# Altium footprint library LukaLIBRARY.PcbLib: 784 footprints (part 46 of 49)
Each footprint in its own frame and in the unit in brackets; x right, y up, seen from the top. Pads: shape width x height; smd on the part's side, far side on the other; paste and mask are expansions set on the pad; w line width, h text height; cw(c..) or ccw(c..) is an arc to the next point about the centre after c.
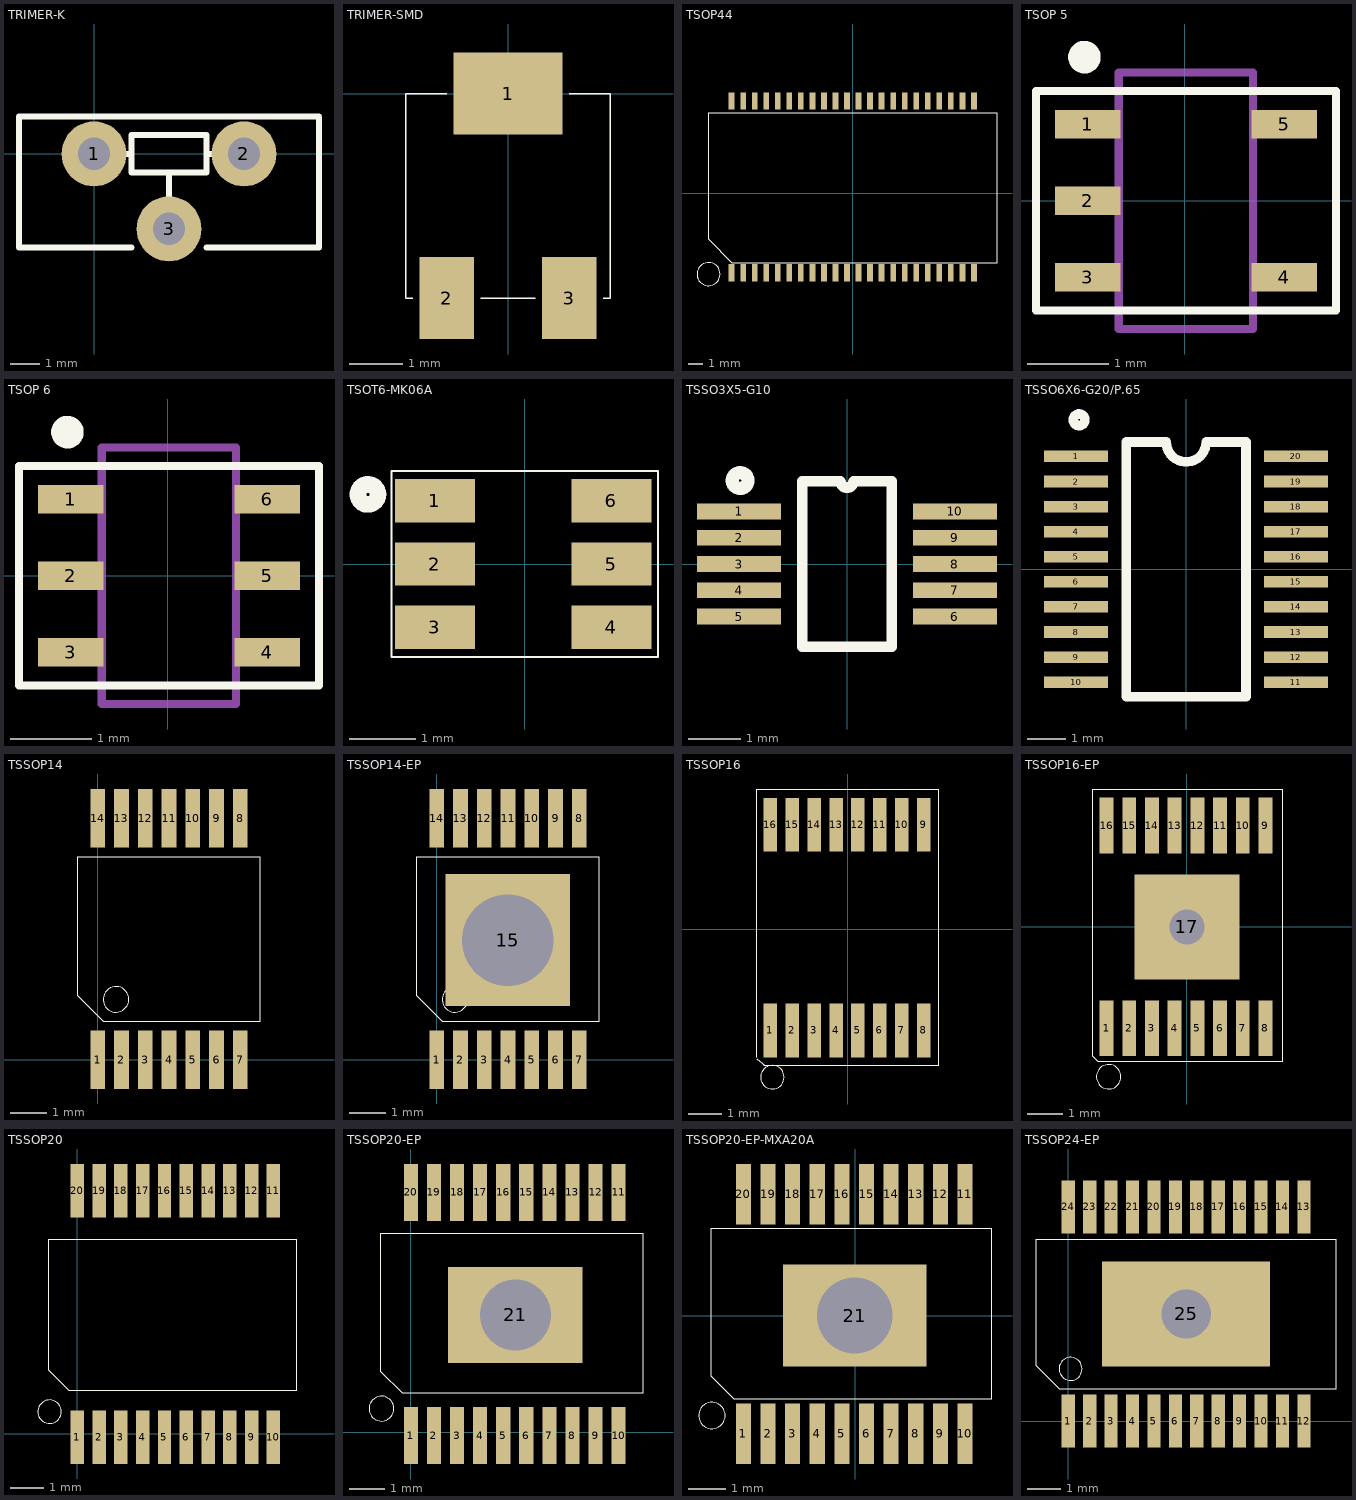
[diagram p45: the footprints below, top view; thin cyan lines are the x and y axes]

## TRIMER-K [mm]
pads (3):
  round 2.2 hole 1.1 mask-25.4: 1(0,0) 2(5.08,0) 3(2.54,-2.54)
Top Overlay:
  lines w0.2: 0.635,0 1.27,0 ; 1.27,-3.175 -2.54,-3.175 -2.54,1.27 7.62,1.27 7.62,-3.175 3.81,-3.175 ; 2.54,-1.905 2.54,-0.635 ; 3.81,0 4.445,0 ; 1.27,-0.635 3.81,-0.635 3.81,0.635 1.27,0.635 1.27,-0.635
Top Solder:
  region: 2.54,-1.431 2.253,-1.468 1.985,-1.579 1.755,-1.755 1.579,-1.985 1.468,-2.253 1.431,-2.54 1.468,-2.827 1.579,-3.095 1.755,-3.325 1.985,-3.501 2.253,-3.612 2.54,-3.649 2.827,-3.612 3.095,-3.501 3.325,-3.325 3.501,-3.095 3.612,-2.827 3.649,-2.54 3.612,-2.253 3.501,-1.985 3.325,-1.755 3.095,-1.579 2.827,-1.468
  region: 5.08,1.109 4.793,1.072 4.525,0.961 4.295,0.785 4.119,0.555 4.008,0.287 3.971,0 4.008,-0.287 4.119,-0.555 4.295,-0.785 4.525,-0.961 4.793,-1.072 5.08,-1.109 5.367,-1.072 5.635,-0.961 5.865,-0.785 6.041,-0.555 6.152,-0.287 6.189,0 6.152,0.287 6.041,0.555 5.865,0.785 5.635,0.961 5.367,1.072
  region: 0,1.109 -0.287,1.072 -0.555,0.961 -0.785,0.785 -0.961,0.555 -1.072,0.287 -1.109,0 -1.072,-0.287 -0.961,-0.555 -0.785,-0.785 -0.555,-0.961 -0.287,-1.072 0,-1.109 0.287,-1.072 0.555,-0.961 0.785,-0.785 0.961,-0.555 1.072,-0.287 1.109,0 1.072,0.287 0.961,0.555 0.785,0.785 0.555,0.961 0.287,1.072
Bottom Solder:
  region: 2.54,-1.431 2.253,-1.468 1.985,-1.579 1.755,-1.755 1.579,-1.985 1.468,-2.253 1.431,-2.54 1.468,-2.827 1.579,-3.095 1.755,-3.325 1.985,-3.501 2.253,-3.612 2.54,-3.649 2.827,-3.612 3.095,-3.501 3.325,-3.325 3.501,-3.095 3.612,-2.827 3.649,-2.54 3.612,-2.253 3.501,-1.985 3.325,-1.755 3.095,-1.579 2.827,-1.468
  region: 5.08,1.109 4.793,1.072 4.525,0.961 4.295,0.785 4.119,0.555 4.008,0.287 3.971,0 4.008,-0.287 4.119,-0.555 4.295,-0.785 4.525,-0.961 4.793,-1.072 5.08,-1.109 5.367,-1.072 5.635,-0.961 5.865,-0.785 6.041,-0.555 6.152,-0.287 6.189,0 6.152,0.287 6.041,0.555 5.865,0.785 5.635,0.961 5.367,1.072
  region: 0,1.109 -0.287,1.072 -0.555,0.961 -0.785,0.785 -0.961,0.555 -1.072,0.287 -1.109,0 -1.072,-0.287 -0.961,-0.555 -0.785,-0.785 -0.555,-0.961 -0.287,-1.072 0,-1.109 0.287,-1.072 0.555,-0.961 0.785,-0.785 0.961,-0.555 1.072,-0.287 1.109,0 1.072,0.287 0.961,0.555 0.785,0.785 0.555,0.961 0.287,1.072

## TRIMER-SMD [mil]
pads (3):
  rect 80x60 smd: 1(0,0)
  rect 40x60 smd: 2(-45,-150) 3(45,-150)
Top Overlay:
  lines w1: -70,-150 -75,-150 -75,0 -45,0 ; -20,-150 20,-150 ; 45,0 75,0 75,-150 70,-150

## TSOP44 [mm]
pads (44):
  rect 0.4x1.2 smd: 1(-8.4,-5.5) 2(-7.6,-5.5) 3(-6.8,-5.5) 4(-6,-5.5) 5(-5.2,-5.5) 6(-4.4,-5.5) 7(-3.6,-5.5) 8(-2.8,-5.5) 9(-2,-5.5) 10(-1.2,-5.5) 11(-0.4,-5.5) 12(0.4,-5.5) 13(1.2,-5.5) 14(2,-5.5) 15(2.8,-5.5) 16(3.6,-5.5) 17(4.4,-5.5) 18(5.2,-5.5) 19(6,-5.5) 20(6.8,-5.5) 21(7.6,-5.5) 22(8.4,-5.5) 23(8.4,6.4) 24(7.6,6.4) 25(6.8,6.4) 26(6,6.4) 27(5.2,6.4) 28(4.4,6.4) 29(3.6,6.4) 30(2.8,6.4) 31(2,6.4) 32(1.2,6.4) 33(0.4,6.4) 34(-0.4,6.4) 35(-1.2,6.4) 36(-2,6.4) 37(-2.8,6.4) 38(-3.6,6.4) 39(-4.4,6.4) 40(-5.2,6.4) 41(-6,6.4) 42(-6.8,6.4) 43(-7.6,6.4) 44(-8.4,6.4)
Top Overlay:
  circle w0.01: c-10,-5.6 r0.8
  lines w0.01: -10,-3.2 -8.4,-4.8 10,-4.8 10,5.6 -10,5.6 -10,-3.2

## TSOP 5 [mm]
pads (5):
  rect 0.8x0.35 smd: 1(-1.194,0.94) 2(-1.194,0) 3(-1.194,-0.94) 4(1.219,-0.94) 5(1.219,0.94)
Top Overlay:
  circle w0.2: c-1.234,1.763 r0.1
  lines w0.1: -1.829,-1.346 -1.829,1.346 1.854,1.346 1.854,-1.346 -1.829,-1.346
Mechanical 15:
  lines w0.1: -0.813,-1.575 0.837,-1.575 0.837,1.575 -0.813,1.575 -0.813,-1.575

## TSOP 6 [mm]
pads (6):
  rect 0.8x0.35 smd: 1(-1.194,0.94) 2(-1.194,0) 3(-1.194,-0.94) 4(1.219,-0.94) 5(1.219,0) 6(1.219,0.94)
Top Overlay:
  circle w0.2: c-1.234,1.763 r0.1
  lines w0.1: -1.829,-1.346 -1.829,1.346 1.854,1.346 1.854,-1.346 -1.829,-1.346
Mechanical 15:
  lines w0.1: -0.813,-1.575 0.837,-1.575 0.837,1.575 -0.813,1.575 -0.813,-1.575

## TSOT6-MK06A [mm]
pads (6):
  rect 1.2x0.65 smd mask-25.4: 1(-1.35,0.95) 2(-1.35,0) 3(-1.35,-0.95) 4(1.3,-0.95) 5(1.3,0) 6(1.3,0.95)
Top Overlay:
  circle w0.25: c-2.355,1.045 r0.15
  lines w0.03: -2,-1.4 2,-1.4 2,1.4 -2,1.4 -2,-1.4
Top Solder:
  region: -1.85,-0.35 -0.85,-0.35 -0.85,0.35 -1.85,0.35
  region: -1.85,-1.3 -0.85,-1.3 -0.85,-0.6 -1.85,-0.6
  region: 0.8,-1.3 1.8,-1.3 1.8,-0.6 0.8,-0.6
  region: 0.8,-0.35 1.8,-0.35 1.8,0.35 0.8,0.35
  region: 0.8,0.6 1.8,0.6 1.8,1.3 0.8,1.3
  region: -1.85,0.6 -0.85,0.6 -0.85,1.3 -1.85,1.3

## TSSO3X5-G10 [mm]
pads (10):
  rect 1.6x0.3 smd: 1(-2.05,1) 2(-2.05,0.5) 3(-2.05,0) 4(-2.05,-0.5) 5(-2.05,-1) 6(2.05,-1) 7(2.05,-0.5) 8(2.05,0) 9(2.05,0.5) 10(2.05,1)
Top Overlay:
  circle w0.25: c-2.032,1.585 r0.15
  lines w0.2: -0.85,-1.575 -0.85,1.575 -0.125,1.575 ccw(c0,1.575) 0.125,1.575 0.85,1.575 0.85,-1.575 -0.85,-1.575

## TSSO6X6-G20/P.65 [mm]
pads (20):
  rect 1.65x0.3 smd: 1(-2.855,2.925) 2(-2.855,2.275) 3(-2.855,1.625) 4(-2.855,0.975) 5(-2.855,0.325) 6(-2.855,-0.325) 7(-2.855,-0.975) 8(-2.855,-1.625) 9(-2.855,-2.275) 10(-2.855,-2.925) 11(2.845,-2.925) 12(2.845,-2.275) 13(2.845,-1.625) 14(2.845,-0.975) 15(2.845,-0.325) 16(2.845,0.325) 17(2.845,0.975) 18(2.845,1.625) 19(2.845,2.275) 20(2.845,2.925)
Top Overlay:
  circle w0.25: c-2.775,3.875 r0.15
  lines w0.25: -1.55,-3.3 -1.55,3.3 -0.517,3.3 ccw(c0,3.3) 0.517,3.3 1.55,3.3 1.55,-3.3 -1.55,-3.3

## TSSOP14 [mm]
pads (14):
  rect 0.4x1.6 smd: 1(0,0) 2(0.65,0) 3(1.3,0) 4(1.95,0) 5(2.6,0) 6(3.25,0) 7(3.9,0) 8(3.9,6.6) 9(3.25,6.6) 10(2.6,6.6) 11(1.95,6.6) 12(1.3,6.6) 13(0.65,6.6) 14(0,6.6)
Top Overlay:
  circle w0.025: c0.5,1.65 r0.35
  lines w0.025: -0.55,1.75 -0.55,5.55 4.45,5.55 4.45,1.05 0.15,1.05 -0.55,1.75

## TSSOP14-EP [mm]
pads (15):
  rect 0.4x1.6 smd: 1(0,0) 2(0.65,0) 3(1.3,0) 4(1.95,0) 5(2.6,0) 6(3.25,0) 7(3.9,0) 8(3.9,6.6) 9(3.25,6.6) 10(2.6,6.6) 11(1.95,6.6) 12(1.3,6.6) 13(0.65,6.6) 14(0,6.6)
  rect 3.4x3.6 hole 2.5 unplated mask-25.4: 15(1.94,3.27)
Top Overlay:
  circle w0.025: c0.5,1.65 r0.35
  lines w0.025: -0.55,1.75 0.15,1.05 4.45,1.05 4.45,5.55 -0.55,5.55 -0.55,1.75
Top Solder:
  region: 0.24,1.47 3.64,1.47 3.64,5.07 0.24,5.07
Bottom Solder:
  region: 0.24,1.47 3.64,1.47 3.64,5.07 0.24,5.07

## TSSOP16 [mm]
pads (16):
  rect 0.4x1.6 smd: 1(-2.3,-3) 2(-1.65,-3) 3(-1,-3) 4(-0.35,-3) 5(0.3,-3) 6(0.95,-3) 7(1.6,-3) 8(2.25,-3) 9(2.25,3.1) 10(1.6,3.1) 11(0.95,3.1) 12(0.3,3.1) 13(-0.35,3.1) 14(-1,3.1) 15(-1.65,3.1) 16(-2.3,3.1)
Top Overlay:
  circle w0.025: c-2.24,-4.39 r0.35
  lines w0.025: -2.7,-3.84 -2.45,-4.05 ; -2.7,-3.8 -2.7,4.16 2.7,4.16 2.7,-4.04 -2.5,-4.04

## TSSOP16-EP [mm]
pads (17):
  rect 0.4x1.6 smd: 1(-2.3,-2.9) 2(-1.65,-2.9) 3(-1,-2.9) 4(-0.35,-2.9) 5(0.3,-2.9) 6(0.95,-2.9) 7(1.6,-2.9) 8(2.25,-2.9) 9(2.25,2.9) 10(1.6,2.9) 11(0.95,2.9) 12(0.3,2.9) 13(-0.35,2.9) 14(-1,2.9) 15(-1.65,2.9) 16(-2.3,2.9)
  rect 3x3 hole 1 unplated mask-25.4: 17(0,0)
Top Overlay:
  circle w0.025: c-2.24,-4.29 r0.35
  lines w0.025: -2.7,-3.7 -2.55,-3.85 2.75,-3.85 2.75,3.95 -2.7,3.95 -2.7,-3.7
Top Solder:
  region: -1.5,-1.5 1.5,-1.5 1.5,1.5 -1.5,1.5
Bottom Solder:
  region: -1.5,-1.5 1.5,-1.5 1.5,1.5 -1.5,1.5

## TSSOP20 [mm]
pads (20):
  rect 0.4x1.6 smd: 1(0,-0.1) 2(0.65,-0.1) 3(1.3,-0.1) 4(1.95,-0.1) 5(2.6,-0.1) 6(3.25,-0.1) 7(3.9,-0.1) 8(4.55,-0.1) 9(5.2,-0.1) 10(5.85,-0.1) 11(5.85,7.25) 12(5.2,7.25) 13(4.55,7.25) 14(3.9,7.25) 15(3.25,7.25) 16(2.6,7.25) 17(1.95,7.25) 18(1.3,7.25) 19(0.65,7.25) 20(0,7.25)
Top Overlay:
  circle w0.025: c-0.83,0.66 r0.35
  lines w0.025: -0.85,1.9 -0.25,1.3 6.55,1.3 6.55,5.8 -0.85,5.8 -0.85,1.9

## TSSOP20-EP [mm]
pads (21):
  rect 0.4x1.6 smd: 1(0,-0.1) 2(0.65,-0.1) 3(1.3,-0.1) 4(1.95,-0.1) 5(2.6,-0.1) 6(3.25,-0.1) 7(3.9,-0.1) 8(4.55,-0.1) 9(5.2,-0.1) 10(5.85,-0.1) 11(5.85,6.75) 12(5.2,6.75) 13(4.55,6.75) 14(3.9,6.75) 15(3.25,6.75) 16(2.6,6.75) 17(1.95,6.75) 18(1.3,6.75) 19(0.65,6.75) 20(0,6.75)
  rect 3.8x2.7 hole 2 unplated mask-25.4: 21(2.94,3.3)
Top Overlay:
  circle w0.025: c-0.83,0.66 r0.35
  lines w0.025: -0.85,1.7 -0.25,1.1 6.55,1.1 6.55,5.6 -0.85,5.6 -0.85,1.7
Top Solder:
  region: 4.84,1.95 4.84,4.65 1.04,4.65 1.04,1.95
Bottom Solder:
  region: 4.84,1.95 4.84,4.65 1.04,4.65 1.04,1.95

## TSSOP20-EP-MXA20A [mm]
pads (21):
  rect 0.4x1.6 smd: 1(-2.95,-3.12) 2(-2.3,-3.12) 3(-1.65,-3.12) 4(-1,-3.12) 5(-0.35,-3.12) 6(0.3,-3.12) 7(0.95,-3.12) 8(1.6,-3.12) 9(2.25,-3.12) 10(2.9,-3.12) 11(2.9,3.2) 12(2.25,3.2) 13(1.6,3.2) 14(0.95,3.2) 15(0.3,3.2) 16(-0.35,3.2) 17(-1,3.2) 18(-1.65,3.2) 19(-2.3,3.2) 20(-2.95,3.2)
  rect 3.8x2.7 hole 2 unplated mask-25.4: 21(-0.01,0)
Top Overlay:
  circle w0.025: c-3.78,-2.64 r0.35
  lines w0.025: -3.8,-1.6 -3.2,-2.2 3.6,-2.2 3.6,2.3 -3.8,2.3 -3.8,-1.6
Top Solder:
  region: 1.89,-1.35 1.89,1.35 -1.91,1.35 -1.91,-1.35
Bottom Solder:
  region: 1.89,-1.35 1.89,1.35 -1.91,1.35 -1.91,-1.35

## TSSOP24-EP [mm]
pads (25):
  rect 0.4x1.6 smd: 1(0,0) 2(0.65,0) 3(1.3,0) 4(1.95,0) 5(2.6,0) 6(3.25,0) 7(3.9,0) 8(4.55,0) 9(5.2,0) 10(5.85,0) 11(6.5,0) 12(7.15,0) 13(7.15,6.5) 14(6.5,6.5) 15(5.85,6.5) 16(5.2,6.5) 17(4.55,6.5) 18(3.9,6.5) 19(3.25,6.5) 20(2.6,6.5) 21(1.95,6.5) 22(1.3,6.5) 23(0.65,6.5) 24(0,6.5)
  rect 5.1x3.2 hole 1.5 unplated mask-25.4: 25(3.575,3.25)
Top Overlay:
  circle w0.025: c0.07,1.585 r0.35
  lines w0.025: -0.98,1.685 -0.975,5.525 8.125,5.525 8.125,0.975 -0.28,0.985 -0.98,1.685
Top Solder:
  region: 1.025,1.65 6.125,1.65 6.125,4.85 1.025,4.85
Bottom Solder:
  region: 1.025,1.65 6.125,1.65 6.125,4.85 1.025,4.85